# Altium footprint library Core429IBaseBoardVerE.PcbLib: 35 footprints (part 3 of 3)
Each footprint in its own frame and in the unit in brackets; x right, y up, seen from the top. Pads: shape width x height; smd on the part's side, far side on the other; paste and mask are expansions set on the pad; w line width, h text height; cw(c..) or ccw(c..) is an arc to the next point about the centre after c.
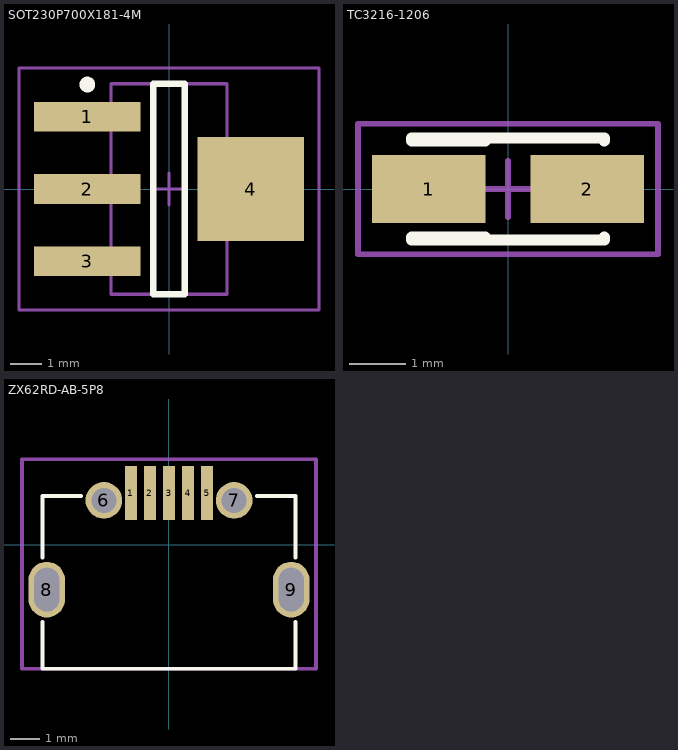
[diagram p2: the footprints below, top view; thin cyan lines are the x and y axes]

## SOT230P700X181-4M [mm] "SOT223, 4-Leads, Body 6,7x7,3mm (max), Pitch 2,30mm, IPC Low Density"
height 1.81
pads (4):
  rect 3.4x0.95 smd: 1(-2.6,2.3) 2(-2.6,0) 3(-2.6,-2.3)
  rect 3.4x3.3 smd: 4(2.6,0)
Top Overlay:
  circle w0.25: c-2.6,3.325 r0.125
  lines w0.2: -0.5,-3.35 0.5,-3.35 0.5,3.35 -0.5,3.35 -0.5,-3.35
Mechanical 13:
  lines w0.1: -1.85,-3.35 1.85,-3.35 1.85,3.35 -1.85,3.35 -1.85,-3.35
Mechanical 15:
  lines w0.1: -0.5,0 0.5,0 ; 0,-0.5 0,0.5 ; -4.775,-3.85 4.775,-3.85 4.775,3.85 -4.775,3.85 -4.775,-3.85
3D body "SOT-223.step": height 1.7, standoff 0.02, extent -3.465,-3.23 3.495,3.27

## TC3216-1206 [mm] "Capacitor, SM Tantalum; Body 3.2 x 1.6 mm (LxW typ)"
height 2.2
pads (2):
  rect 2x1.2 smd: 1(-1.4,0) 2(1.4,0)
Top Overlay:
  lines w0.2: -1.7,-0.9 1.7,-0.9 1.7,-0.85 ; -1.7,-0.85 -0.4,-0.85 ; -1.7,0.85 -0.4,0.85 ; -1.7,0.9 1.7,0.9 1.7,0.85
Mechanical 15:
  lines w0.1: -0.5,0 0.5,0 ; 0,-0.5 0,0.5 ; -2.65,-1.15 2.65,-1.15 2.65,1.15 -2.65,1.15 -2.65,-1.15
3D body "Tantalum Capacitor Case A.STEP": height 1.67, standoff 0.02, extent -1.7,-0.825 1.691,0.775

## ZX62RD-AB-5P8 [mm] "USB Micro AB - Standard (Bottom mount), Shell through hole"
height 2.8
pads (9):
  rect 0.4x1.85 smd: 1(-1.3,1.775) 2(-0.65,1.775) 3(0,1.775) 4(0.65,1.775) 5(1.3,1.775)
  round 1.25 hole 0.85: 6(-2.225,1.525) 7(2.225,1.525)
  oval 1.25x1.9 hole 0.85 slot 1.5 at 90 deg: 8(-4.175,-1.525) 9(4.175,-1.525)
Top Overlay:
  lines w0.127: -4.325,-2.625 -4.325,-4.225 4.325,-4.225 4.325,-2.625 ; -4.325,-0.425 -4.325,1.675 -3,1.675 ; 3,1.675 4.325,1.675 4.325,-0.425
Mechanical 15:
  lines w0.127: -5.025,-4.225 -5.025,2.925 5.025,2.925 5.025,-4.225 -5.025,-4.225
3D body "48285.stp": height 2.79, standoff -0.58, extent -4.325,-4.224 4.325,1.675